# Altium footprint library self_pcblib.PcbLib: 94 footprints (part 1 of 6)
Each footprint in its own frame and in the unit in brackets; x right, y up, seen from the top. Pads: shape width x height; smd on the part's side, far side on the other; paste and mask are expansions set on the pad; w line width, h text height; cw(c..) or ccw(c..) is an arc to the next point about the centre after c.
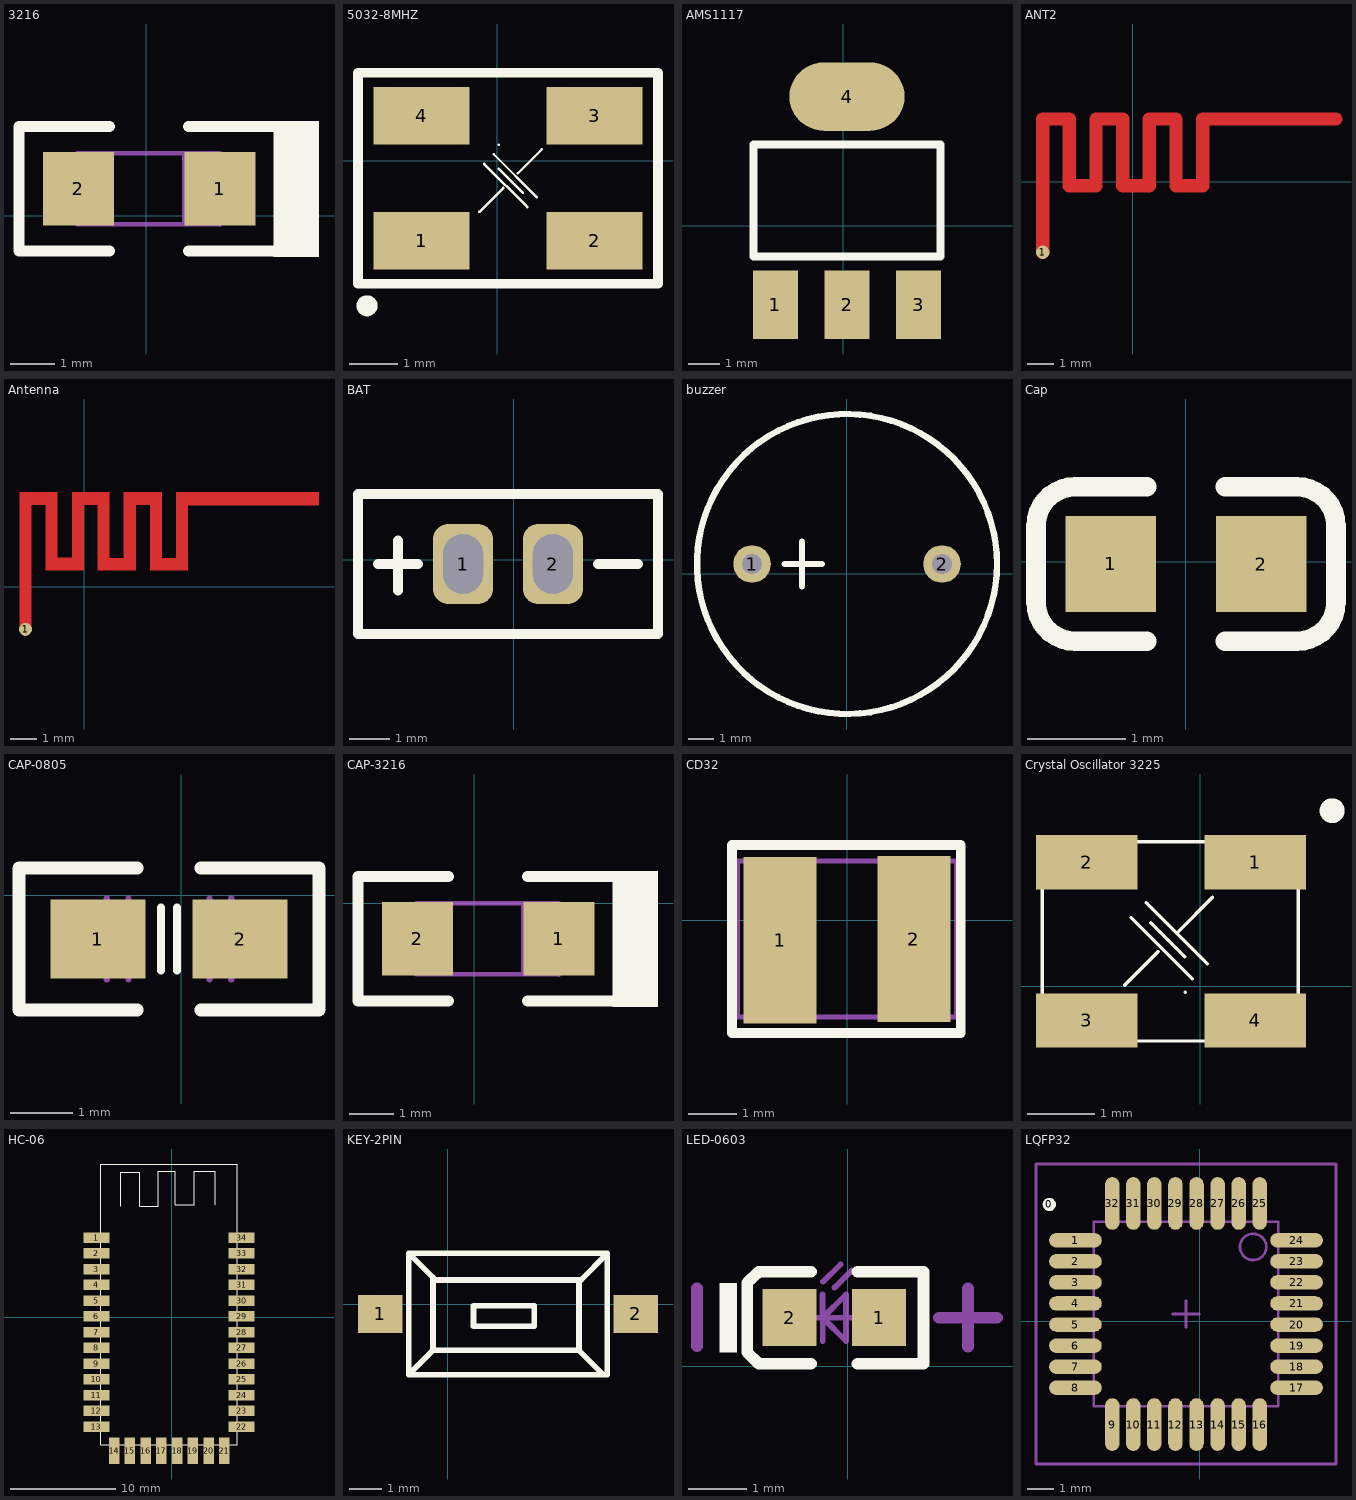
[diagram p0: the footprints below, top view; thin cyan lines are the x and y axes]

## 3216 [mm]
pads (2):
  rect 1.6x1.65 smd: 1(1.659,0.608) 2(-1.516,0.608)
Top Overlay:
  rectangle: 2.866,-0.929 3.882,2.132
  lines w0.254: -0.817,-0.789 -2.849,-0.789 -2.849,2.005 -0.817,2.005 ; 0.961,-0.789 2.866,-0.789 ; 0.961,2.005 2.866,2.005
Mechanical 1:
  lines w0.1: -1.567,-0.002 -1.719,-0.002 -1.719,1.116 -1.541,1.116 ; 0.859,-0.192 0.859,1.408 ; 1.659,-0.205 1.659,-0.027 ; 1.659,-0.192 -1.541,-0.192 -1.541,1.408 1.659,1.408 1.659,-0.027 ; 1.684,1.116 1.862,1.116 1.837,1.091 1.837,-0.027 1.659,-0.027
3D body: height 1.8, standoff 0, extent -1.692,-0.332 1.708,1.468

## 5032-8MHZ [mm]
pads (4):
  rect 2x1.2 smd: 1(-1.568,-1.667) 2(2.032,-1.667) 3(2.032,0.933) 4(-1.568,0.933)
Top Overlay:
  circle w0.254: c-2.708,-3.023 r0.092
  lines w0.051: -0.368,-1.067 0.132,-0.567 ; -0.268,-0.067 0.632,-0.967 ; -0.068,0.133 0.832,-0.767 ; 0.032,-0.167 0.532,-0.667 ; 0.432,-0.267 0.932,0.233 ; 0.132,-0.567 0.132,-0.567 ; 0.932,0.233 0.932,0.233 ; 0.032,0.333 0.032,0.333
  lines w0.203: -2.896,-2.565 3.353,-2.565 3.353,1.829 -2.896,1.829 -2.896,-2.565
3D body: height 1, standoff 0, extent -2.371,-2.083 2.829,1.317

## AMS1117 [mm]
pads (4):
  rect 1.45x2.2 smd: 1(-2.173,-2.54) 2(0.127,-2.54) 3(2.427,-2.54)
  oval 3.7x2.2 smd: 4(0.127,4.155)
Top Overlay:
  lines w0.254: -2.873,-0.992 3.127,-0.992 3.127,2.607 -2.873,2.607 -2.873,-0.992
3D body: height 1.85, standoff -0.01, extent -3.175,-2.763 3.325,4.237

## ANT2 [mm]
pads (1):
  round 0.5 smd: 1(-3.378,-2.642)
Top Layer:
  lines w0.5: -3.378,-2.642 -3.378,2.358 -2.378,2.358 -2.378,-0.142 -1.378,-0.142 -1.378,2.318 ; -1.378,2.358 -0.378,2.358 -0.378,-0.142 0.622,-0.142 0.622,2.348 ; 0.622,2.358 1.622,2.358 1.622,-0.142 2.622,-0.142 2.622,2.358 7.622,2.358

## Antenna [mm]
pads (1):
  round 0.5 smd: 1(-2.261,-1.626)
Top Layer:
  rectangle: -2.489,-1.626 -2.032,3.632
  rectangle: -2.489,3.15 -1.067,3.632
  rectangle: -1.499,0.635 -1.041,3.632
  rectangle: -1.499,0.635 -0.025,1.121
  rectangle: -0.483,0.635 -0.025,3.628
  rectangle: 0.508,0.635 0.965,3.632
  rectangle: 1.499,0.635 1.981,3.632
  rectangle: 2.515,0.635 2.972,3.632
  rectangle: 3.505,0.635 3.962,3.632
  rectangle: -0.483,3.15 0.965,3.632
  rectangle: 0.508,0.635 1.93,1.118
  rectangle: 1.524,3.15 2.946,3.632
  rectangle: 2.515,0.635 3.937,1.118
  rectangle: 3.505,3.124 8.992,3.632

## BAT [mm]
pads (2):
  rrect50% 1.5x2 hole 1 slot 1.5 at 90 deg: 1(-1.27,-0.102) 2(0.976,-0.102)
Top Overlay:
  lines w0.25: -3.397,-0.102 -2.397,-0.102 ; -2.897,-0.77 -2.897,0.48 ; 2.103,-0.102 3.103,-0.102 ; -3.897,-1.852 3.603,-1.852 3.603,1.648 -3.897,1.648 -3.897,-1.852

## buzzer [mm]
pads (2):
  round 1.5 hole 0.8: 1(-3.79,0.381) 2(3.81,0.381)
Top Overlay:
  circle w0.254: c0.009,0.381 r6.001
  lines w0.254: -2.49,0.381 -0.99,0.381 ; -1.79,-0.519 -1.79,1.281
3D body: height 9.65, standoff -4.5, extent -9.454,-5.822 6,6.178

## Cap [mm]
pads (2):
  rect 0.93x0.98 smd: 1(-0.77,-0.025) 2(0.77,-0.025)
Top Overlay:
  lines w0.2: -0.4,-0.815 -1.135,-0.815 cw(c-1.135,-0.415) -1.535,-0.415 -1.535,0.365 cw(c-1.135,0.365) -1.135,0.765 -0.4,0.765 ; 0.4,-0.815 1.135,-0.815 ccw(c1.135,-0.415) 1.535,-0.415 1.535,0.365 ccw(c1.135,0.365) 1.135,0.765 0.4,0.765
3D body: height 0.3, standoff 0, extent -0.8,-0.425 0.8,0.375

## CAP-0805 [mm]
pads (2):
  rect 1.524x1.27 smd: 1(-1.343,-0.7) 2(0.943,-0.7)
Top Overlay:
  lines w0.127: -0.327,-1.208 -0.327,-0.192 ; -0.073,-1.208 -0.073,-0.192
  lines w0.203: -0.708,-1.843 -2.613,-1.843 -2.613,0.443 -0.708,0.443 ; 0.308,-1.843 2.213,-1.843 2.213,0.443 0.308,0.443
Mechanical 1:
  lines w0.1: -1.2,-1.35 -1.2,-0.05 ; -0.85,-1.35 -0.85,-0.05 ; 0.45,-1.35 0.45,-0.05 ; 0.8,-1.35 0.8,-0.05
3D body: height 0.5, standoff 0, extent 0.435,-1.335 0.816,-0.065
3D body: height 0.5, standoff 0, extent -0.835,-1.335 0.435,-0.065
3D body: height 0.5, standoff 0, extent -1.216,-1.335 -0.835,-0.065

## CAP-3216 [mm]
pads (2):
  rect 1.6x1.65 smd: 1(1.905,-0.791) 2(-1.27,-0.791)
Top Overlay:
  rectangle: 3.112,-2.327 4.128,0.733
  lines w0.254: -0.571,-2.188 -2.603,-2.188 -2.603,0.606 -0.571,0.606 ; 1.207,-2.188 3.112,-2.188 ; 1.207,0.606 3.112,0.606
Mechanical 1:
  lines w0.1: -1.321,-1.4 -1.473,-1.4 -1.473,-0.283 -1.295,-0.283 ; 1.105,-1.591 1.105,0.009 ; 1.905,-1.603 1.905,-1.426 ; 1.905,-1.591 -1.295,-1.591 -1.295,0.009 1.905,0.009 1.905,-1.426 ; 1.931,-0.283 2.108,-0.283 2.083,-0.308 2.083,-1.426 1.905,-1.426
3D body: height 1.8, standoff 0, extent -1.446,-1.73 1.954,0.07

## CD32 [mm]
pads (2):
  rect 1.5x3.42 smd: 1(-1.372,-0.406) 2(1.372,-0.381)
Top Overlay:
  lines w0.2: -2.362,-2.311 -2.362,1.549 2.337,1.549 2.337,-2.311 -2.362,-2.311
Mechanical 13:
  lines w0.1: -2.25,-1.981 -2.25,1.219 2.25,1.219 2.25,-1.981 -2.25,-1.981
3D body: height 2.1, standoff 0, extent -1.676,-1.88 1.625,1.12

## Crystal Oscillator 3225 [mm]
pads (4):
  rect 1.5x0.8 smd: 1(0.813,1.829) 2(-1.676,1.829) 3(-1.676,-0.508) 4(0.813,-0.508)
Top Overlay:
  circle w0.254: c1.95,2.591 r0.057
  lines w0.051: -1.018,1.01 -0.118,0.11 ; -0.798,1.23 0.102,0.33 ; -0.729,0.932 -0.229,0.432 ; -0.618,0.51 -1.118,0.01 ; 0.182,1.31 -0.318,0.81 ; -1.118,0.01 -1.118,0.01 ; -0.318,0.81 -0.318,0.81 ; -2.334,-0.813 -2.334,2.134 1.448,2.134 1.448,-0.813 -2.334,-0.813 ; -0.218,-0.09 -0.218,-0.09
3D body: height 0.61, standoff 0, extent -2.057,-0.59 1.143,1.91

## HC-06 [mm]
pads (34):
  rect 2.5x1 smd: 1(-7.171,7.604) 2(-7.171,6.104) 3(-7.171,4.604) 4(-7.171,3.104) 5(-7.171,1.604) 6(-7.171,0.104) 7(-7.171,-1.396) 8(-7.171,-2.896) 9(-7.171,-4.396) 10(-7.171,-5.896) 11(-7.171,-7.396) 12(-7.171,-8.896) 13(-7.171,-10.396) 22(6.629,-10.396) 23(6.629,-8.896) 24(6.629,-7.396) 25(6.629,-5.896) 26(6.629,-4.396) 27(6.629,-2.896) 28(6.629,-1.396) 29(6.629,0.104) 30(6.629,1.604) 31(6.629,3.104) 32(6.629,4.604) 33(6.629,6.104) 34(6.629,7.604)
  rect 1x2.5 smd: 14(-5.496,-12.696) 15(-3.996,-12.696) 16(-2.496,-12.696) 17(-0.996,-12.696) 18(0.504,-12.696) 19(2.004,-12.696) 20(3.504,-12.696) 21(5.004,-12.696)
Top Overlay:
  lines w0.1: -4.871,10.604 -4.871,13.804 -3.071,13.804 -3.071,10.604 -1.271,10.604 -1.271,13.904 0.329,13.904 0.329,10.704 2.129,10.704 2.129,13.904 4.129,13.904 4.129,10.704 ; -6.771,-12.096 6.229,-12.096 6.229,14.604 -6.771,14.604 -6.771,-12.096
3D body: height 0, standoff -2.35, extent -7.271,-12.201 6.749,15.809

## KEY-2PIN [mm]
pads (2):
  rect 1.4x1.2 smd: 1(-2.119,-0.305) 2(5.881,-0.305)
Top Overlay:
  lines w0.178: -0.468,0.838 -0.468,-1.443 ; 4.104,0.699 4.104,-1.448 ; 4.993,1.595 -1.23,1.595 ; -1.23,-2.205 -0.468,-1.443 ; -1.23,-2.205 4.993,-2.205 ; -1.23,-2.205 -1.23,1.595 ; -1.23,1.595 -1.225,1.595 -0.392,0.762 4.167,0.762 4.993,1.588 4.993,-2.205 ; -0.468,-1.443 4.099,-1.443 4.104,-1.448 ; 4.104,-1.448 4.861,-2.205 4.993,-2.205 ; 0.802,-0.686 2.707,-0.686 2.707,-0.051 0.802,-0.051 0.802,-0.686
3D body: height 1.9, standoff 0, extent -1.42,-1.905 5.18,1.295

## LED-0603 [mm]
pads (2):
  rect 0.93x0.98 smd: 1(0.541,0.838) 2(-0.999,0.838)
Top Overlay:
  rectangle: -2.204,0.238 -1.904,1.438
  lines w0.2: -0.629,0.048 -1.529,0.048 -1.729,0.241 -1.729,1.435 -1.529,1.628 -0.629,1.628 ; 0.171,0.048 1.306,0.048 1.306,1.628 0.171,1.628
Mechanical 13:
  lines w0.1: -0.629,0.838 0.171,0.838 ; -0.429,0.438 -0.429,1.238 ; -0.424,1.455 -0.124,1.755 ; -0.224,1.355 0.076,1.655 ; -0.429,0.838 -0.029,0.438 -0.029,1.238 -0.429,0.838
Mechanical 15:
  lines w0.203: -2.591,0.346 -2.591,1.346 ; 1.571,0.838 2.571,0.838 ; 2.071,0.338 2.071,1.338
3D body: height 0.6, standoff 0, extent -1.028,0.438 0.572,1.238

## LQFP32 [mm]
pads (33):
  round 0.508 on Top Overlay: 0(-5.715,4.445)
  oval 2x0.55 smd: 1(-4.723,3.082) 2(-4.723,2.282) 3(-4.723,1.482) 4(-4.723,0.682) 5(-4.723,-0.118) 6(-4.723,-0.918) 7(-4.723,-1.718) 8(-4.723,-2.518) 17(3.677,-2.518) 18(3.677,-1.718) 19(3.677,-0.918) 20(3.677,-0.118) 21(3.677,0.682) 22(3.677,1.482) 23(3.677,2.282) 24(3.677,3.082)
  oval 0.55x2 smd: 9(-3.323,-3.918) 10(-2.523,-3.918) 11(-1.723,-3.918) 12(-0.923,-3.918) 13(-0.123,-3.918) 14(0.677,-3.918) 15(1.477,-3.918) 16(2.277,-3.918) 25(2.277,4.482) 26(1.477,4.482) 27(0.677,4.482) 28(-0.123,4.482) 29(-0.923,4.482) 30(-1.723,4.482) 31(-2.523,4.482) 32(-3.323,4.482)
Mechanical 13:
  circle w0.1: c2.027,2.832 r0.5
  lines w0.1: -4.023,-3.218 -4.023,3.782 2.977,3.782 2.977,-3.218 -4.023,-3.218
Mechanical 15:
  lines w0.1: -1.023,0.282 -0.023,0.282 ; -0.523,-0.218 -0.523,0.782 ; -6.223,-5.418 -6.223,5.982 5.177,5.982 5.177,-5.418 -6.223,-5.418
3D body: height 1.63, standoff -0.09, extent -4.998,-4.214 4.002,4.786